# Altium footprint library u025Library.PcbLib: 144 footprints (part 7 of 9)
Each footprint in its own frame and in the unit in brackets; x right, y up, seen from the top. Pads: shape width x height; smd on the part's side, far side on the other; paste and mask are expansions set on the pad; w line width, h text height; cw(c..) or ccw(c..) is an arc to the next point about the centre after c.
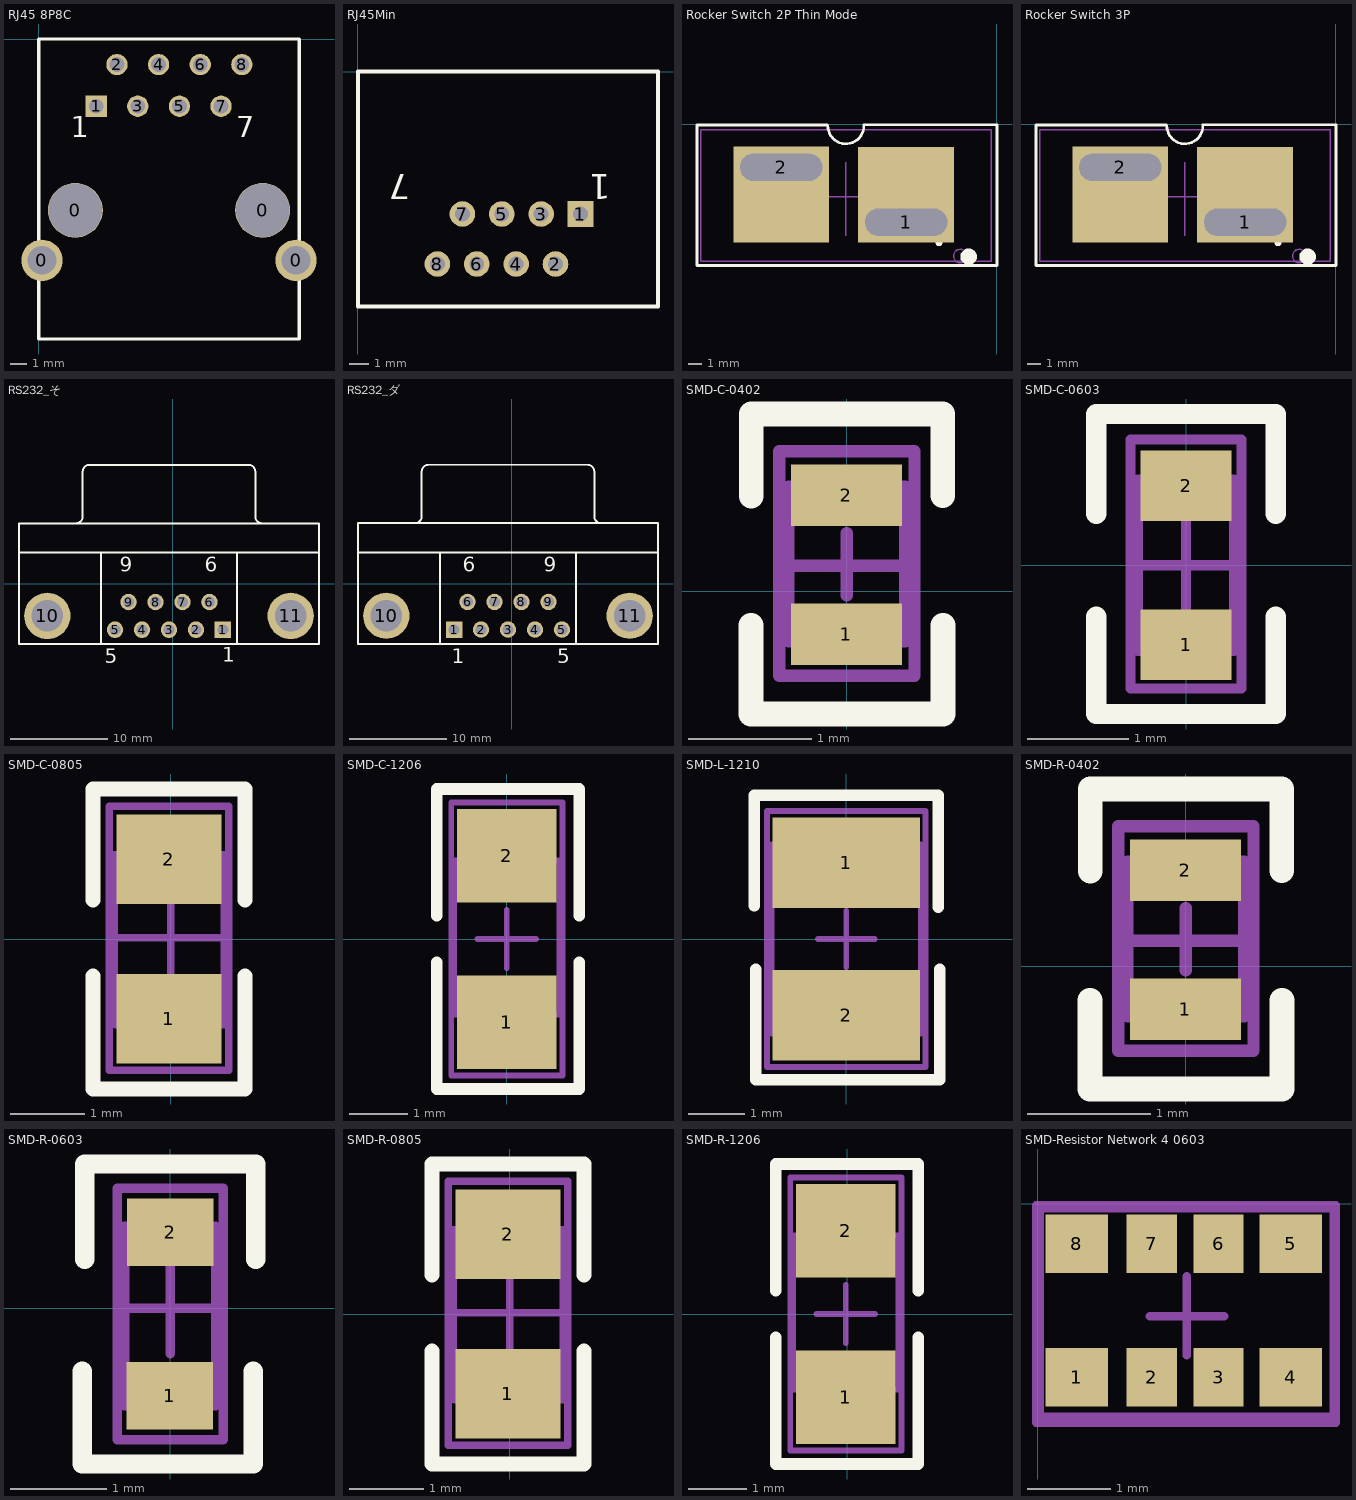
[diagram p6: the footprints below, top view; thin cyan lines are the x and y axes]

## RJ45 8P8C [mm] "RJ45 8P8C"
pads (12):
  round 2.524 hole 1.75: 0(0.2,-13.5) 0(15.7,-13.5)
  round 3.35 hole 3.25: 0(2.235,-10.45) 0(13.665,-10.45)
  rect 1.3x1.3 hole 0.9: 1(3.505,-4.1)
  round 1.3 hole 0.9: 2(4.775,-1.56) 3(6.045,-4.1) 4(7.315,-1.56) 5(8.585,-4.1) 6(9.855,-1.56) 7(11.125,-4.1) 8(12.395,-1.56)
Top Overlay:
  lines w0.203: 15.898,-18.3 15.898,0 ; 15.898,-18.279 15.877,-18.3 0,-18.3 0,0 15.9,0
  text "7" at 12.05,-6 h1.27
  text "1" at 1.962,-6 h1.27

## RJ45Min [mm] "RJ45Min"
pads (8):
  rect 1.3x1.3 hole 0.75: 1(11.309,-7.227)
  round 1.3 hole 0.75: 2(10.039,-9.767) 3(9.309,-7.227) 4(8.039,-9.767) 5(7.309,-7.227) 6(6.039,-9.767) 7(5.309,-7.227) 8(4.039,-9.767)
Top Overlay:
  lines w0.203: 0.006,-11.926 0.006,0.012 15.246,0.012 15.246,-11.926 0.006,-11.926
  text "7" at 2.673,-5.195 h1.27
  text "1" at 12.833,-5.195 h1.27

## Rocker Switch 2P Thin Mode [mm] "Rocker Switch 2P Thin Mode"
height 5.6
pads (2):
  rect 7x7 hole 2 slot 6 at 0 deg copper offset 0,2: 1(-6.597,-7.138)
  rect 7x7 hole 2 slot 6 at 0 deg copper offset 0,-2: 2(-15.716,-3.128)
Top Overlay:
  circle w0.6: c-2.038,-9.66 r0.3
  circle w0.25: c-4.198,-8.64 r0.125
  lines w0.2: -12.365,-0.042 -21.866,-0.042 -21.866,-10.294 0.036,-10.294 0.036,-0.016 -9.698,-0.016 ; -12.313,-0.094 ccw(c-11,-0.104) -9.687,-0.067
Mechanical 13:
  circle w0.1: c-2.638,-9.61 r0.5
  lines w0.1: -21.581,-9.983 -0.379,-9.983 -0.379,-0.379 -21.581,-0.379 -21.581,-9.983
Mechanical 15:
  lines w0.1: -14.876,-5.293 -7.161,-5.293 ; -11.003,-8.119 -11.003,-2.76
3D body: height 20, standoff -9.18, extent -21.54,-9.964 -0.458,-0.465

## Rocker Switch 3P [mm] "Rocker Switch 3P"
height 5.6
pads (2):
  rect 7x7 hole 2 slot 6 at 0 deg copper offset 0,2: 1(-6.597,-7.138)
  rect 7x7 hole 2 slot 6 at 0 deg copper offset 0,-2: 2(-15.716,-3.128)
Top Overlay:
  circle w0.25: c-4.198,-8.64 r0.125
  circle w0.6: c-2.038,-9.66 r0.3
  lines w0.2: -12.365,-0.042 -21.866,-0.042 -21.866,-10.294 0.036,-10.294 0.036,-0.016 -9.698,-0.016 ; -12.313,-0.094 ccw(c-11,-0.104) -9.687,-0.067
Mechanical 13:
  circle w0.1: c-2.638,-9.61 r0.5
  lines w0.1: -21.581,-9.983 -21.581,-0.379 -0.379,-0.379 -0.379,-9.983 -21.581,-9.983
Mechanical 15:
  lines w0.1: -14.876,-5.293 -7.161,-5.293 ; -11.003,-8.119 -11.003,-2.76
3D body: height 20, standoff -9.18, extent -21.54,-9.964 -0.458,-0.465

## RS232_そ [mm] "RS232_そ"
pads (11):
  rect 1.69x1.69 hole 1.09: 1(5.159,-4.697)
  round 1.69 hole 1.09: 2(2.389,-4.697) 3(-0.381,-4.697) 4(-3.151,-4.697) 5(-5.921,-4.697) 6(3.774,-1.857) 7(1.004,-1.857) 8(-1.766,-1.857) 9(-4.536,-1.857)
  round 4.76 hole 3.26: 10(-12.876,-3.277) 11(12.114,-3.277)
Top Overlay:
  lines w0.2: -15.781,3.223 15.019,3.223 ; -9.941,6.228 ccw(c-9.941,6.923) -9.246,6.923 -9.246,11.523 ; -9.241,11.528 cw(c-8.546,11.528) -8.546,12.223 7.784,12.223 cw(c7.784,11.528) 8.479,11.528 ; -7.381,-6.177 -7.381,3.223 ; 6.619,-6.177 6.619,3.223 ; 8.484,11.523 8.484,6.923 ccw(c9.179,6.923) 9.179,6.228 ; -15.781,-6.177 -15.781,6.223 15.019,6.223 15.019,-6.177 -15.781,-6.177
  text "1" at 5.08,-8.001 h1.5
  text "5" at -6.985,-8.128 h1.5
  text "9" at -5.461,1.27 h1.5
  text "6" at 3.302,1.27 h1.5
3D body: height 6.25, standoff -10.05, extent -15.202,-6.299 15.608,12.901

## RS232_ダ [mm] "RS232_ダ"
pads (11):
  rect 1.69x1.69 hole 1.09: 1(-5.921,-4.697)
  round 1.69 hole 1.09: 2(-3.151,-4.697) 3(-0.381,-4.697) 4(2.389,-4.697) 5(5.159,-4.697) 6(-4.536,-1.857) 7(-1.766,-1.857) 8(1.004,-1.857) 9(3.774,-1.857)
  round 4.76 hole 3.26: 10(-12.876,-3.277) 11(12.114,-3.277)
Top Overlay:
  lines w0.2: -15.781,3.223 15.019,3.223 ; -9.941,6.228 ccw(c-9.941,6.923) -9.246,6.923 -9.246,11.523 ; -9.241,11.528 cw(c-8.546,11.528) -8.546,12.223 7.784,12.223 cw(c7.784,11.528) 8.479,11.528 ; -7.381,-6.177 -7.381,3.223 ; 6.619,-6.177 6.619,3.223 ; 8.484,11.523 8.484,6.923 ccw(c9.179,6.923) 9.179,6.228 ; -15.781,-6.177 -15.781,6.223 15.019,6.223 15.019,-6.177 -15.781,-6.177
  text "1" at -6.171,-8.152 h1.5
  text "5" at 4.659,-8.152 h1.5
  text "9" at 3.274,1.248 h1.5
  text "6" at -5.036,1.248 h1.5
3D body: height 6.25, standoff -10.05, extent -15.989,-6.388 14.821,12.012

## SMD-C-0402 [mm] "Chip, Body 10x0.4mm, IPC High Density"
height 0.45
pads (2):
  rect 0.9x0.5 smd: 1(-0.003,-0.348) 2(-0.003,0.782)
Top Overlay:
  lines w0.2: -0.78,-0.277 -0.78,-0.998 0.774,-0.998 ; -0.78,0.774 -0.78,1.443 0.782,1.443 0.782,0.778 ; 0.782,-0.998 0.782,-0.277
Mechanical 13:
  lines w0.1: -0.475,-0.409 0.475,-0.409 0.475,0.85 -0.475,0.85 -0.475,-0.409
Mechanical 15:
  lines w0.1: -0.473,0.209 0.477,0.209 ; 0,-0.034 0,0.475 ; -0.55,-0.688 -0.55,1.14 0.55,1.14 0.55,-0.688 -0.55,-0.688
3D body: height 0.6, standoff 0, extent -0.254,-0.27 0.246,0.73

## SMD-C-0603 [mm] "Chip, Body 1.6x0.8mm, IPC High Density"
height 2
pads (2):
  rect 0.9x0.7 smd: 1(0,-0.787) 2(0,0.787)
Top Overlay:
  lines w0.2: -0.889,-0.508 -0.889,-1.473 0.889,-1.473 0.889,-0.508 ; -0.889,0.508 -0.889,1.499 0.889,1.499 0.889,0.508
Mechanical 13:
  lines w0.1: -0.475,-0.85 0.475,-0.85 0.475,0.85 -0.475,0.85 -0.475,-0.85
Mechanical 15:
  lines w0.1: -0.475,0 0.475,0 ; 0,-0.475 0,0.475 ; -0.55,-1.219 0.55,-1.219 0.55,1.245 -0.55,1.245 -0.55,-1.219
3D body: height 0.9, standoff 0, extent -0.4,-0.825 0.4,0.775

## SMD-C-0805 [mm] "Chip  , Body 2 x 1.2mm, IPC High Density"
height 2
pads (2):
  rect 1.4x1.2 smd: 1(-0.025,-1.067) 2(-0.025,1.067)
Top Overlay:
  lines w0.2: -1.041,-0.494 -1.041,-2.007 0.991,-2.007 0.991,-0.494 ; -1.041,0.522 -1.041,2.007 0.991,2.007 0.991,0.522
Mechanical 13:
  lines w0.1: -0.754,-1.143 -0.754,1.129 ; -0.748,1.125 0.711,1.125 0.711,-1.151 -0.737,-1.151
Mechanical 15:
  lines w0.1: -0.794,0.014 0.775,0.014 ; 0,-1.524 0,1.499 ; -0.825,-1.753 -0.825,1.778 0.775,1.778 0.775,-1.753 -0.825,-1.753
3D body: height 1, standoff 0, extent -0.65,-1.025 0.6,0.975

## SMD-C-1206 [mm] "Chip , Body 3.2x1.6mm, IPC High Density"
height 2
pads (2):
  rect 1.7x1.6 smd: 1(0,-1.422) 2(0,1.422)
Top Overlay:
  lines w0.2: -1.2,-0.4 -1.2,-2.565 1.241,-2.565 1.241,-0.4 ; -1.2,0.4 -1.2,2.565 1.241,2.565 1.241,0.4
Mechanical 13:
  lines w0.1: -0.9,-1.295 0.9,-1.295 0.9,1.346 -0.9,1.346 -0.9,-1.295
Mechanical 15:
  lines w0.1: -0.5,0 0.5,0 ; 0,-0.5 0,0.5 ; -0.95,-2.337 0.95,-2.337 0.95,2.337 -0.95,2.337 -0.95,-2.337
3D body: height 1, standoff 0, extent -0.8,-1.625 0.8,1.575

## SMD-L-1210 [mm] "SMD-L-1210"
height 0.9
pads (2):
  rect 2.6x1.6 smd: 1(0,1.35) 2(0,-1.35)
Top Overlay:
  lines w0.2: -1.625,0.584 -1.625,2.54 1.626,2.54 1.626,0.559 ; -1.6,-0.533 -1.6,-2.489 1.651,-2.489 1.651,-0.533
Mechanical 13:
  lines w0.1: -1.32,-1.675 1.32,-1.675 1.32,1.675 -1.32,1.675 -1.32,-1.675
Mechanical 15:
  lines w0.1: -0.5,0 0.5,0 ; 0,-0.5 0,0.5 ; -1.4,-2.261 1.4,-2.261 1.4,2.261 -1.4,2.261 -1.4,-2.261
3D body: height 1.25, standoff -1.25, extent -1.295,-1.575 1.205,1.625

## SMD-R-0402 [mm] "Chip, Body 10x0.4mm, IPC High Density"
height 0.45
pads (2):
  rect 0.9x0.5 smd: 1(-0.003,-0.348) 2(-0.003,0.782)
Top Overlay:
  lines w0.2: -0.78,-0.277 -0.78,-0.998 0.774,-0.998 ; -0.78,0.774 -0.78,1.443 0.782,1.443 0.782,0.778 ; 0.782,-0.998 0.782,-0.277
Mechanical 13:
  lines w0.1: -0.475,-0.409 0.475,-0.409 0.475,0.85 -0.475,0.85 -0.475,-0.409
Mechanical 15:
  lines w0.1: -0.473,0.209 0.477,0.209 ; 0,-0.034 0,0.475 ; -0.55,-0.688 -0.55,1.14 0.55,1.14 0.55,-0.688 -0.55,-0.688
3D body: height 0.35, standoff 0, extent -0.269,-0.283 0.231,0.717

## SMD-R-0603 [mm] "Chip, Body 1.6x0.8mm, IPC High Density"
height 0.45
pads (2):
  rect 0.9x0.7 smd: 1(-0.005,-0.911) 2(0,0.787)
Top Overlay:
  lines w0.2: -0.914,-0.657 -0.914,-1.622 0.864,-1.622 0.864,-0.657 ; -0.889,0.508 -0.889,1.499 0.889,1.499 0.889,0.508
Mechanical 13:
  lines w0.1: -0.475,-1.016 -0.475,0.85 0.475,0.85 0.475,-1.016 -0.475,-1.016
Mechanical 15:
  lines w0.1: -0.475,0 0.475,0 ; 0,-0.475 0,0.475 ; -0.55,-1.368 0.55,-1.368 0.55,1.245 -0.55,1.245 -0.55,-1.368
3D body: height 0.45, standoff 0, extent -0.425,-0.724 0.425,0.826

## SMD-R-0805 [mm] "Chip  , Body 2 x 1.2mm, IPC High Density"
height 0.45
pads (2):
  rect 1.4x1.2 smd: 1(-0.025,-1.067) 2(-0.025,1.067)
Top Overlay:
  lines w0.2: -1.041,-0.494 -1.041,-2.007 0.991,-2.007 0.991,-0.494 ; -1.041,0.522 -1.041,2.007 0.991,2.007 0.991,0.522
Mechanical 13:
  lines w0.1: -0.754,-1.143 -0.754,1.129 ; -0.748,1.125 0.711,1.125 0.711,-1.151 -0.737,-1.151
Mechanical 15:
  lines w0.1: -0.794,0.014 0.775,0.014 ; 0,-1.524 0,1.499 ; -0.825,-1.753 -0.825,1.778 0.775,1.778 0.775,-1.753 -0.825,-1.753
3D body: height 0.45, standoff 0, extent -0.65,-0.924 0.6,1.076

## SMD-R-1206 [mm] "Chip , Body 3.2x1.6mm, IPC High Density"
height 0.45
pads (2):
  rect 1.7x1.6 smd: 1(-0.025,-1.422) 2(-0.025,1.422)
Top Overlay:
  lines w0.2: -1.225,-0.4 -1.225,-2.565 1.216,-2.565 1.216,-0.4 ; -1.225,0.4 -1.225,2.565 1.216,2.565 1.216,0.4
Mechanical 13:
  lines w0.1: -0.925,-1.295 0.875,-1.295 0.875,1.346 -0.925,1.346 -0.925,-1.295
Mechanical 15:
  lines w0.1: -0.525,0 0.475,0 ; -0.025,-0.5 -0.025,0.5 ; -0.975,-2.337 0.925,-2.337 0.925,2.337 -0.975,2.337 -0.975,-2.337
3D body: height 0.55, standoff 0, extent -0.825,-1.6 0.775,1.6

## SMD-Resistor Network 4 0603 [mm] "SMD-Resistor Network 4 0603 32mm*16mm"
height 1.3
pads (8):
  rect 0.75x0.7 smd: 1(0.465,-2.082) 4(3.029,-2.082) 5(3.029,-0.482) 8(0.465,-0.482)
  rect 0.6x0.7 smd: 2(1.365,-2.082) 3(2.165,-2.082) 6(2.165,-0.482) 7(1.365,-0.482)
Mechanical 13:
  lines w0.1: 3.543,-0.084 3.543,-2.553 0.025,-2.553 0.025,-0.057 3.543,-0.057
Mechanical 15:
  lines w0.1: 1.342,-1.349 2.232,-1.349 ; 1.782,-1.82 1.782,-0.87 ; 3.573,-2.628 -0.023,-2.628 -0.023,-0.018 3.573,-0.018 3.573,-2.627
3D body: height 0.65, standoff 0, extent 0.158,-2.171 3.358,-0.571